# Altium footprint library TranDangKhoa-LIB.PcbLib: 1435 footprints (part 14 of 90)
Each footprint in its own frame and in the unit in brackets; x right, y up, seen from the top. Pads: shape width x height; smd on the part's side, far side on the other; paste and mask are expansions set on the pad; w line width, h text height; cw(c..) or ccw(c..) is an arc to the next point about the centre after c.
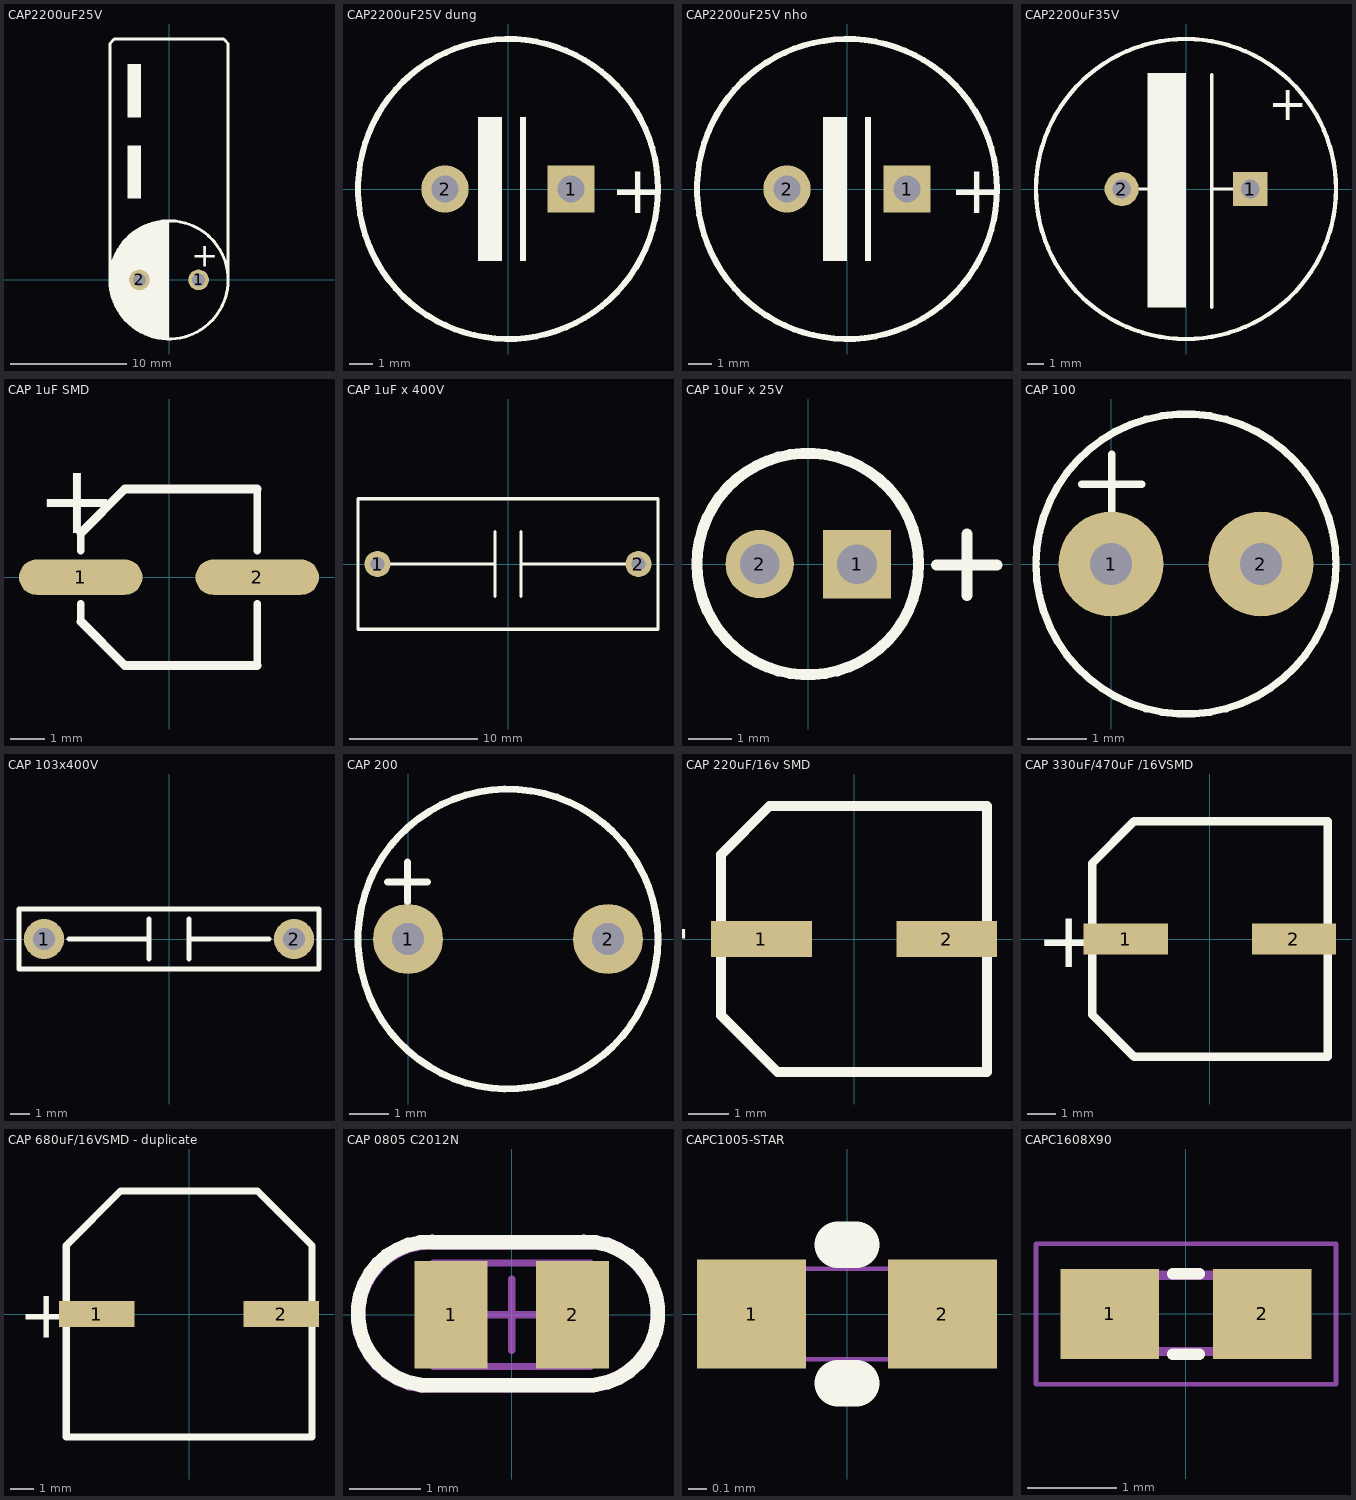
[diagram p13: the footprints below, top view; thin cyan lines are the x and y axes]

## CAP2200uF25V [mil] "2200uFX25V"
pads (2):
  round 70 hole 43.31: 1(100,0) 2(-100,0)
Top Overlay:
  circle w10: c0,0 r200
  region: -95,455 -140,455 -140,275 -95,275
  rectangle: -140,550 -95,730
  rectangle: -100,-110 -40,100
  rectangle: -50,-195 0,195
  lines w10: -200,-5 -200,800 -185,815 185,815 200,800 200,0
  lines w100: -54.85,139.61 ccw(c0,0) -50.45,-141.26
  text "+" at 75,45 h80

## CAP2200uF25V dung [mm] "2200uFX25V dung"
height 12.7
pads (2):
  rect 2x2 hole 1.143: 1(2.667,0)
  round 2 hole 1.143: 2(-2.667,0)
Top Overlay:
  circle w0.254: c0,0 r6.35
  rectangle: -1.27,-3.048 -0.254,3.048
  rectangle: 0.508,-3.048 0.762,3.048
  text "+" at 4.318,-1.016 h2.03

## CAP2200uF25V nho [mm] "2200uFX25V loai nho"
height 20.32
pads (2):
  rect 2x2 hole 1.143: 1(2.54,0)
  round 2 hole 1.143: 2(-2.54,0)
Top Overlay:
  circle w0.254: c0,0 r6.35
  rectangle: 0.762,-3.048 1.016,3.048
  rectangle: -1.016,-3.048 0,3.048
  text "+" at 4.318,-1.016 h2.03

## CAP2200uF35V [mil]
pads (2):
  rect 80x80 hole 43.31: 1(150,0)
  round 80 hole 43.31: 2(-150,0)
Top Overlay:
  circle w10: c0,0 r350
  rectangle: -90,-277 0,271
  lines w7.87: -120.94,0 -70,0 ; 60,-276 60,267 ; 61.06,0 120,0
  text "+" at 192,161 h80

## CAP 1uF SMD [mil] "TU SMD"
pads (2):
  oval 140x40 smd: 1(-100,0) 2(100,0)
Top Overlay:
  lines w8: -100,-50 -100,-30 ; -100,30 -100,50 ; 100,-100 100,-30 ; 100,30 100,100
  lines w10: -100,-50 -50,-100 100,-100 ; -100,50 -50,100 50,100 100,100
  text "+" at -150,50 h80

## CAP 1uF x 400V [mil] "Capacitor, tu khong phan cuc 1uF 400V"
pads (2):
  round 80 hole 43.31: 1(-400,0) 2(400,0)
Top Overlay:
  lines w10: -360,0 -40,0 ; -40,-100 -40,100 ; 40,-100 40,100 ; 40,0 360,0 ; -460,-200 460,-200 460,200 -460,200 -460,-200

## CAP 10uF x 25V [mil]
pads (2):
  rect 62x62 hole 36: 1(44.18,-0.1)
  round 62 hole 36: 2(-44.18,0.1)
Top Overlay:
  circle w10: c-0.51,0.1 r100.64
  lines w10: 116.45,-0.62 171.3,-0.62 ; 144.27,-28.71 144.27,27.2

## CAP 100 [mil]
pads (2):
  round 70 hole 28 unplated: 1(0,0) 2(100,0)
Top Overlay:
  circle w5: c50,0 r100
  lines w5: -19.5,53.25 20.5,53.25 ; 0.5,33.25 0.5,73.25

## CAP 103x400V [mil] "Capacitor, tu khong phan cuc 103 400V"
pads (2):
  round 80 hole 43.31: 1(-250,0) 2(250,0)
Top Overlay:
  lines w10: -200,0 -40,0 ; -40,-40 -40,40 ; 40,-40 40,40 ; 40,0 200,0 ; -300,-60 -300,60 300,60 300,-60 -300,-60
3D body "SW3dPS-Cap 10n - 630V Poly_2009.STEP": height 430, standoff -118.11, extent -240.98,-100 260.98,87.05

## CAP 200 [mil]
pads (2):
  round 70 hole 32 unplated: 1(0,0) 2(200,0)
Top Overlay:
  circle w7: c100,0 r150
  lines w7: -20.5,57 19.5,57 ; -0.5,37 -0.5,77

## CAP 220uF/16v SMD [mm] "TU SMD"
pads (2):
  rect 2.5x0.9 smd: 1(-2.3,0) 2(2.3,0)
Top Overlay:
  lines w0.25: -3.3,-1.9 -1.9,-3.3 3.3,-3.3 3.3,3.3 -2.1,3.3 -3.3,2.1 -3.3,-1.9
  text "+" at -3.9,1 h2.03
3D body "Part1.STEP": height 7.76, standoff 0.01, extent -3.542,-3.3 3.542,3.3

## CAP 330uF/470uF /16VSMD [mm] "TU SMD"
pads (2):
  rect 3x1.1 smd: 1(-3,0) 2(3,0)
Top Overlay:
  lines w0.3: -4.2,-2.7 -2.7,-4.2 4.2,-4.2 4.2,4.2 -2.7,4.2 -4.2,2.7 -4.2,-2.7
  text "+" at -6.2,-1 h2.03
3D body "Part2.STEP": height 10.73, standoff -0.04, extent -4.522,-4.15 4.522,4.15

## CAP 680uF/16VSMD - duplicate [mm] "TU SMD"
pads (2):
  rect 3.2x1.1 smd: 1(-3.9,0) 2(3.9,0)
Top Overlay:
  lines w0.3: -5.2,-5.2 -5.2,2.9 -2.9,5.2 2.9,5.2 5.2,2.9 5.2,-5.2 -5.2,-5.2
  text "+" at -7.2,-1 h2.03

## CAP 0805 C2012N [mm] "Chip Capacitor, Body 2.0x1.3mm, IPC Medium Density"
height 1.1
pads (2):
  rect 1.017x1.5 smd: 1(-0.85,0) 2(0.85,0)
Top Overlay:
  lines w0.203: -1.27,-0.984 1.143,-0.984 ; -1.27,1.016 1.143,1.016 ; -1.11,-0.988 cw(c-1.147,0.016) -1.11,1.021 ; 1.004,-0.988 ccw(c1.041,0.016) 1.005,1.02
Mechanical 13:
  lines w0.1: -1.1,-0.725 -1.1,0.725 1.1,0.725 1.1,-0.725 -1.1,-0.725
Mechanical 15:
  lines w0.1: -0.5,0 0.5,0 ; 0,-0.5 0,0.5
  lines w0.203: -1.27,-0.984 1.143,-0.984 ccw(c1.041,0.016) 1.143,1.016 -1.097,1.016 ; -1.248,-0.996 cw(c-1.147,0.004) -1.248,1.004
3D body "0805(2012M) Cap.step": height 0.79, standoff 0, extent -1.228,-0.589 1.28,0.656

## CAPC1005-STAR [mm]
pads (2):
  rect 0.6x0.6 smd: 1(-0.525,0) 2(0.525,0)
Top Overlay:
  lines w0.254: -0.051,-0.381 0.051,-0.381 ; -0.051,0.381 0.051,0.381
Mechanical 7:
  lines w0.025: -0.5,-0.25 -0.5,0.25 0.5,0.25 0.5,-0.25 -0.5,-0.25
  text ".Comment" at -0.475,-0.2 h0.14
  text ".Designator" at -0.475,0.075 h0.14
3D body: height 0.4, standoff 0.05, extent -0.571,-0.301 -0.228,0.299
3D body: height 0.4, standoff 0.05, extent 0.23,-0.3 0.573,0.3
3D body: height 0.4, standoff 0.05, extent -0.233,-0.299 0.236,0.301

## CAPC1608X90 [mm]
pads (2):
  rect 1.1x1 smd: 1(-0.85,0) 2(0.85,0)
Top Overlay:
  lines w0.127: -0.15,-0.45 0.15,-0.45 ; -0.15,0.45 0.15,0.45
Mechanical 13:
  region: 0.83,-0.471 0.331,-0.471 0.331,0.48 0.83,0.48
  region: -0.338,-0.47 -0.839,-0.47 -0.839,0.48 -0.338,0.48
  lines w0.102: -0.356,-0.419 0.356,-0.419 ; -0.356,0.432 0.356,0.432
Mechanical 15:
  lines w0.051: -1.673,-0.783 -1.673,0.783 1.673,0.783 1.673,-0.783 -1.673,-0.783
3D body "step_temp.STEP": height 0.9, standoff 0, extent -0.8,-0.4 0.8,0.4